# Altium footprint library Tienanh.PcbLib: 190 footprints (part 1 of 12)
Each footprint in its own frame and in the unit in brackets; x right, y up, seen from the top. Pads: shape width x height; smd on the part's side, far side on the other; paste and mask are expansions set on the pad; w line width, h text height; cw(c..) or ccw(c..) is an arc to the next point about the centre after c.
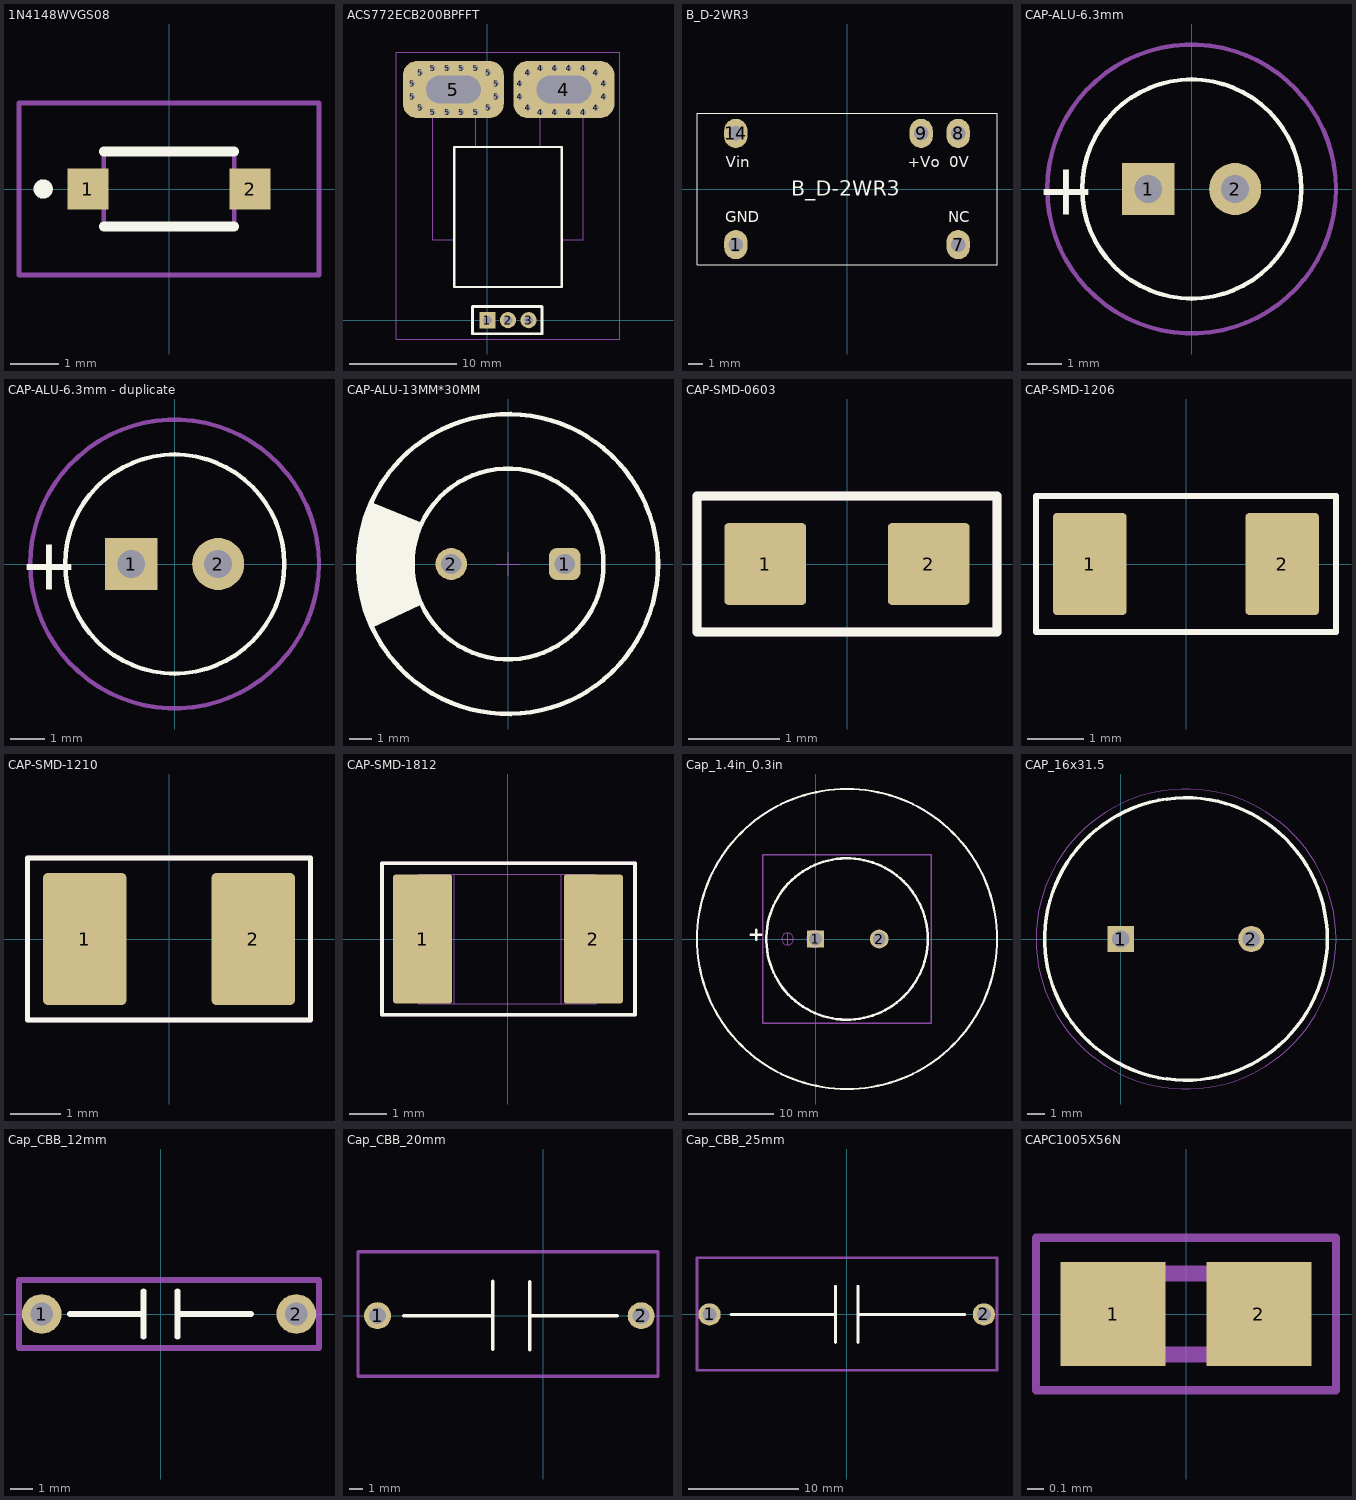
[diagram p0: the footprints below, top view; thin cyan lines are the x and y axes]

## 1N4148WVGS08 [mm]
pads (2):
  rect 0.85x0.85 smd: 1(-1.675,0) 2(1.675,0)
Top Overlay:
  lines w0.2: -1.35,-0.775 1.35,-0.775 ; -1.35,0.775 1.35,0.775 ; -2.6,-0.1 cw(c-2.6,0) -2.6,0.1 cw(c-2.6,0) -2.6,-0.1
Mechanical 13:
  lines w0.1: -1.35,-0.775 1.35,-0.775 1.35,0.775 -1.35,0.775 -1.35,-0.775
Mechanical 15:
  lines w0.1: -3.1,-1.775 3.1,-1.775 3.1,1.775 -3.1,1.775 -3.1,-1.775
3D body "1N4148W-V-GS08.stp": height 1.26, standoff 0, extent -1.854,-0.775 1.854,0.775

## ACS772ECB200BPFFT [mm]
pads (37):
  rect 1.5x1.5 hole 0.8: 1(0,0)
  round 1.5 hole 0.8: 2(1.91,0) 3(3.82,0)
  round 1 hole 0.5: 4(3.008,20.782) 4(3.008,22.018) 4(3.734,19.782) 4(3.734,23.018) 4(4.91,19.35) 4(4.91,23.45) 4(6.243,19.35) 4(6.243,23.45) 4(7.577,19.35) 4(7.577,23.45) 4(8.91,19.35) 4(8.91,23.45) 4(10.086,19.782) 4(10.086,23.018) 4(10.812,20.782) 4(10.812,22.018) 5(-6.992,20.782) 5(-6.992,22.018) 5(-6.266,19.782) 5(-6.266,23.018) 5(-5.09,19.35) 5(-5.09,23.45) 5(-3.757,19.35) 5(-3.757,23.45) 5(-2.423,19.35) 5(-2.423,23.45) 5(-1.09,19.35) 5(-1.09,23.45) 5(0.086,19.782) 5(0.086,23.018) 5(0.812,20.782) 5(0.812,22.018)
  rrect50% 9.398x5.334 hole 2.54 slot 5.08 at 0 deg: 4(7.11,21.463) 5(-3.175,21.463)
Top Overlay:
  lines w0.2: -3.09,3.1 6.91,3.1 6.91,16.1 -3.09,16.1 -3.09,3.1
  lines w0.254: -1.397,-1.27 5.08,-1.27 5.08,1.27 -1.397,1.27 -1.397,-1.27
Mechanical 13:
  lines w0.1: -3.09,7.5 -5.09,7.5 -5.09,20.3 -1.09,20.3 -1.09,16.1 ; 4.91,16.1 4.91,20.3 8.91,20.3 8.91,7.5 6.91,7.5 ; -3.09,3.1 6.91,3.1 6.91,16.1 -3.09,16.1 -3.09,3.1
Mechanical 15:
  lines w0.1: -8.492,-1.75 12.312,-1.75 12.312,24.95 -8.492,24.95 -8.492,-1.75
3D body "ACS758LCB-100B-PFF-T.stp": height 6.97, standoff -3.57, extent -5.062,-0.484 8.938,22.333

## B_D-2WR3 [mm]
pads (5):
  oval 1.6x2 hole 1: 1(-7.62,-3.81) 7(7.62,-3.81) 8(7.62,3.81) 9(5.08,3.81) 14(-7.62,3.81)
Top Overlay:
  lines w0.076: -10.285,-5.205 10.285,-5.205 10.285,5.205 -10.285,5.205 -10.285,-5.205
  text "NC" at 6.936,-2.268 h0.76
  text "Vin" at -8.32,1.491 h0.76
  text "GND" at -8.364,-2.268 h0.76
  text "0V" at 7.027,1.491 h0.76
  text "+Vo" at 4.16,1.491 h0.76
  text "B_D-2WR3" at -3.809,-0.475 h1.02
3D body "B_D-2WR3.stp": height 8.42, standoff -3.88, extent -10.16,-5.08 10.16,5.08

## CAP-ALU-6.3mm [mm] "Polarized capacitors, Aluminum Electrolytic Capacitors, 2-Leads, Body 6.3x15x2.5x0.5"
height 15
pads (2):
  rect 1.5x1.5 hole 0.8: 1(-1.25,0)
  round 1.5 hole 0.8: 2(1.25,0)
Top Overlay:
  circle w0.127: c0,0 r3.15
  text "+" at -4.475,-0.737 h1.5
Mechanical 15:
  circle w0.127: c0,0 r4.15
3D body "User Library-Cap 6_3x11.STEP": height 11, standoff -19, extent -3.125,-3.15 3.175,3.15

## CAP-ALU-6.3mm - duplicate [mm] "Polarized capacitors, Aluminum Electrolytic Capacitors, 2-Leads, Body 6.3x15x2.5x0.5"
height 15
pads (2):
  rect 1.5x1.5 hole 0.8: 1(-1.25,0)
  round 1.5 hole 0.8: 2(1.25,0)
Top Overlay:
  circle w0.127: c0,0 r3.15
  text "+" at -4.475,-0.737 h1.5
Mechanical 15:
  circle w0.127: c0,0 r4.15
3D body "User Library-Cap 6_3x11.STEP": height 11, standoff -19, extent -3.125,-3.15 3.175,3.15

## CAP-ALU-13MM*30MM [mm]
pads (2):
  rrect50% 1.4x1.4 hole 0.9 mask+0.075: 1(2.5,0)
  round 1.4 hole 0.9 mask+0.075: 2(-2.5,0)
Top Overlay:
  circle w0.2: c0,0 r6.6
  circle w0.2: c0,0 r4.2
  region: -6,-2.8 -6.1,-2.4 -6.295,-1.824 -6.54,-1.1 -6.54,-0.349 -6.54,0.349 -6.49,0.996 -6.436,1.703 -6.007,2.72 -3.871,1.826 -3.957,1.608 -4.096,1.161 -4.189,0.702 -4.235,0.235 -4.236,-0.233 -4.189,-0.699 -4.096,-1.158 -3.958,-1.606 -3.872,-1.824
Top Courtyard:
  lines w0.05: -0.5,0 0.5,0 ; 0,-0.5 0,0.5
3D body "User Library-CAPAER_D125_L325_P050_W006X030.STEP": height 32.52, standoff -3, extent -6.26,-6.25 6.25,6.25

## CAP-SMD-0603 [mm]
pads (2):
  rrect10% 0.9x0.9 smd mask+0.07: 1(-0.9,0) 2(0.9,0)
Top Overlay:
  lines w0.1: -1.65,-0.75 1.65,-0.75 1.65,0.75 -1.65,0.75 -1.65,-0.75
Top Assembly:
  lines w0.1: -1.65,-0.75 1.65,-0.75 1.65,0.75 -1.65,0.75 -1.65,-0.75
3D body "User Library-0603 SMD Capacitor.step": height 0.3, standoff 0, extent -0.8,-0.4 0.8,0.4

## CAP-SMD-1206 [mm]
pads (2):
  rrect10% 1.3x1.8 smd mask+0.07: 1(-1.7,0) 2(1.7,0)
Top Overlay:
  lines w0.1: -2.65,-1.2 2.65,-1.2 2.65,1.2 -2.65,1.2 -2.65,-1.2
Top Assembly:
  lines w0.1: -2.65,-1.2 2.65,-1.2 2.65,1.2 -2.65,1.2 -2.65,-1.2
3D body "1206 SMD Capacitor.step": height 1.02, standoff 0.02, extent -1.6,-0.8 1.6,0.8

## CAP-SMD-1210 [mm]
height 44
pads (2):
  rrect10% 1.65x2.6 smd mask+0.07: 1(-1.664,0) 2(1.664,0)
Top Overlay:
  lines w0.1: -2.8,-1.6 2.5,-1.6 2.8,-1.6 2.8,1.6 -2.8,1.6 -2.8,0.2 -2.8,-1.6
Top Assembly:
  lines w0.1: -2.8,-1.6 2.8,-1.6 2.8,1.6 -2.8,1.6 -2.8,-1.6
3D body "User Library-1210(3225M) Cap.STEP": height 1.7, standoff 0, extent -2,-1.244 2,1.245

## CAP-SMD-1812 [mm]
pads (2):
  rrect10% 1.6x3.5 smd mask+0.07: 1(-2.3,0) 2(2.325,0)
Top Overlay:
  lines w0.1: -3.4,-2.05 -3.4,2.05 3.45,2.05 3.45,-2.05 -3.4,-2.05
Mechanical 1:
  lines w0.025: -2.4,-1.75 -2.4,1.75 ; -2.4,-1.75 2.4,-1.75 ; -2.4,-1.75 -1.45,-1.75 -1.45,1.75 -2.4,1.75 ; -2.4,-1.75 -2.4,1.75 ; -2.4,1.75 2.4,1.75 ; 2.4,-1.75 2.4,1.75 ; 2.4,-1.75 2.4,1.75 ; 2.4,-1.75 1.45,-1.75 1.45,1.75 2.4,1.75
Top Assembly:
  lines w0.1: -3.4,-2.05 -3.4,2.05 3.45,2.05 3.45,-2.05 -3.4,-2.05
3D body "CAPC480350_180N_KEM.step": height 1.8, standoff 0, extent -2.4,-1.75 2.4,1.75

## Cap_1.4in_0.3in [mm]
pads (2):
  rect 2x2 hole 1.5 mask+0.1: 1(0,0)
  round 2.2 hole 1.5 mask+0.1: 2(7.5,0)
Top Overlay:
  circle w0.254: c3.7,0 r17.655
  circle w0.3: c3.7,0 r9.5
  lines w0.3: -7.6,0.5 -6.4,0.5 ; -7,-0.1 -7,1.1
Mechanical 1:
  circle w0.05: c3.7,0 r9.5
  circle w0.05: c-0.05,0 r1
  circle w0.05: c7.45,0 r1
  circle w0.05: c-3.3,0 r0.7
  lines w0.05: -4,0 -2.6,0 ; -3.3,-0.7 -3.3,0.7
Mechanical 15:
  lines w0.2: -6.2,-9.9 -6.2,9.9 13.6,9.9 13.6,-9.9 -6.2,-9.9
3D body "CAP16x25.STEP": height 25.3, standoff -1.2, extent -4.297,-7.999 11.697,7.998

## CAP_16x31.5 [mm]
pads (2):
  rect 1.5x1.5 hole 1: 1(0,0)
  round 1.5 hole 1: 2(7.5,0)
Top Overlay:
  circle w0.2: c3.75,0 r8.125
Mechanical 13:
  circle w0.1: c3.75,0 r8.125
Mechanical 15:
  circle w0.05: c3.75,0 r8.625
3D body "User Library-Cap-EL(16x31_5-7_5)T.STEP": height 41, standoff -3, extent -4.19,-8 11.812,8

## Cap_CBB_12mm [mil]
pads (2):
  round 70 hole 40 unplated: 1(-210,0) 2(240,0)
Top Overlay:
  lines w10: -160,0 -30,0 ; -30,-40 -30,40 ; 30,-40 30,40 ; 30,0 160,0
Mechanical 15:
  lines w10: -250,-60 280,-60 280,60 -250,60 -250,-60
3D body "CAP-104-600V.STEP": height 415.92, standoff -100, extent -246.48,-48.43 266.48,50

## Cap_CBB_20mm [mil]
pads (2):
  round 80 hole 50 unplated: 1(-492.13,0) 2(290,0)
Top Overlay:
  lines w10: -415,0 -150,0 ; -150,-100 -150,102.44 ; -40,-101.22 -40,101.22 ; -40,0 220,0
Mechanical 15:
  lines w10: -550,-180 340,-180 340,190 -550,190 -550,-180

## Cap_CBB_25mm [mil]
pads (2):
  round 80 hole 50 unplated: 1(-492.13,0) 2(492.13,0)
Top Overlay:
  lines w10: -415,0 -40,0 ; -40,-101.22 -40,101.22 ; 40,-101.22 40,101.22 ; 40,0 423.29,0
Mechanical 15:
  lines w10: -537,-200 539,-200 539,203 -537,203 -537,-200
3D body "Capacitor de Polyester CBB 25mm.step": height 937.4, standoff -125.59, extent -536.61,-201.62 538.2,200.74

## CAPC1005X56N [mm]
pads (2):
  rect 0.65x0.64 smd: 1(-0.45,0) 2(0.45,0)
Mechanical 13:
  lines w0.1: -0.5,-0.25 -0.5,0.25 0.5,0.25 0.5,-0.25 -0.5,-0.25
Mechanical 15:
  lines w0.05: -0.925,-0.47 -0.925,0.47 0.925,0.47 0.925,-0.47 -0.925,-0.47
3D body "0402ZD225MAT2A.stp": height 0.56, standoff 0, extent -0.5,-0.25 0.5,0.25